# Altium footprint library Kintex_SDR.PcbLib: 72 footprints (part 1 of 5)
Each footprint in its own frame and in the unit in brackets; x right, y up, seen from the top. Pads: shape width x height; smd on the part's side, far side on the other; paste and mask are expansions set on the pad; w line width, h text height; cw(c..) or ccw(c..) is an arc to the next point about the centre after c.
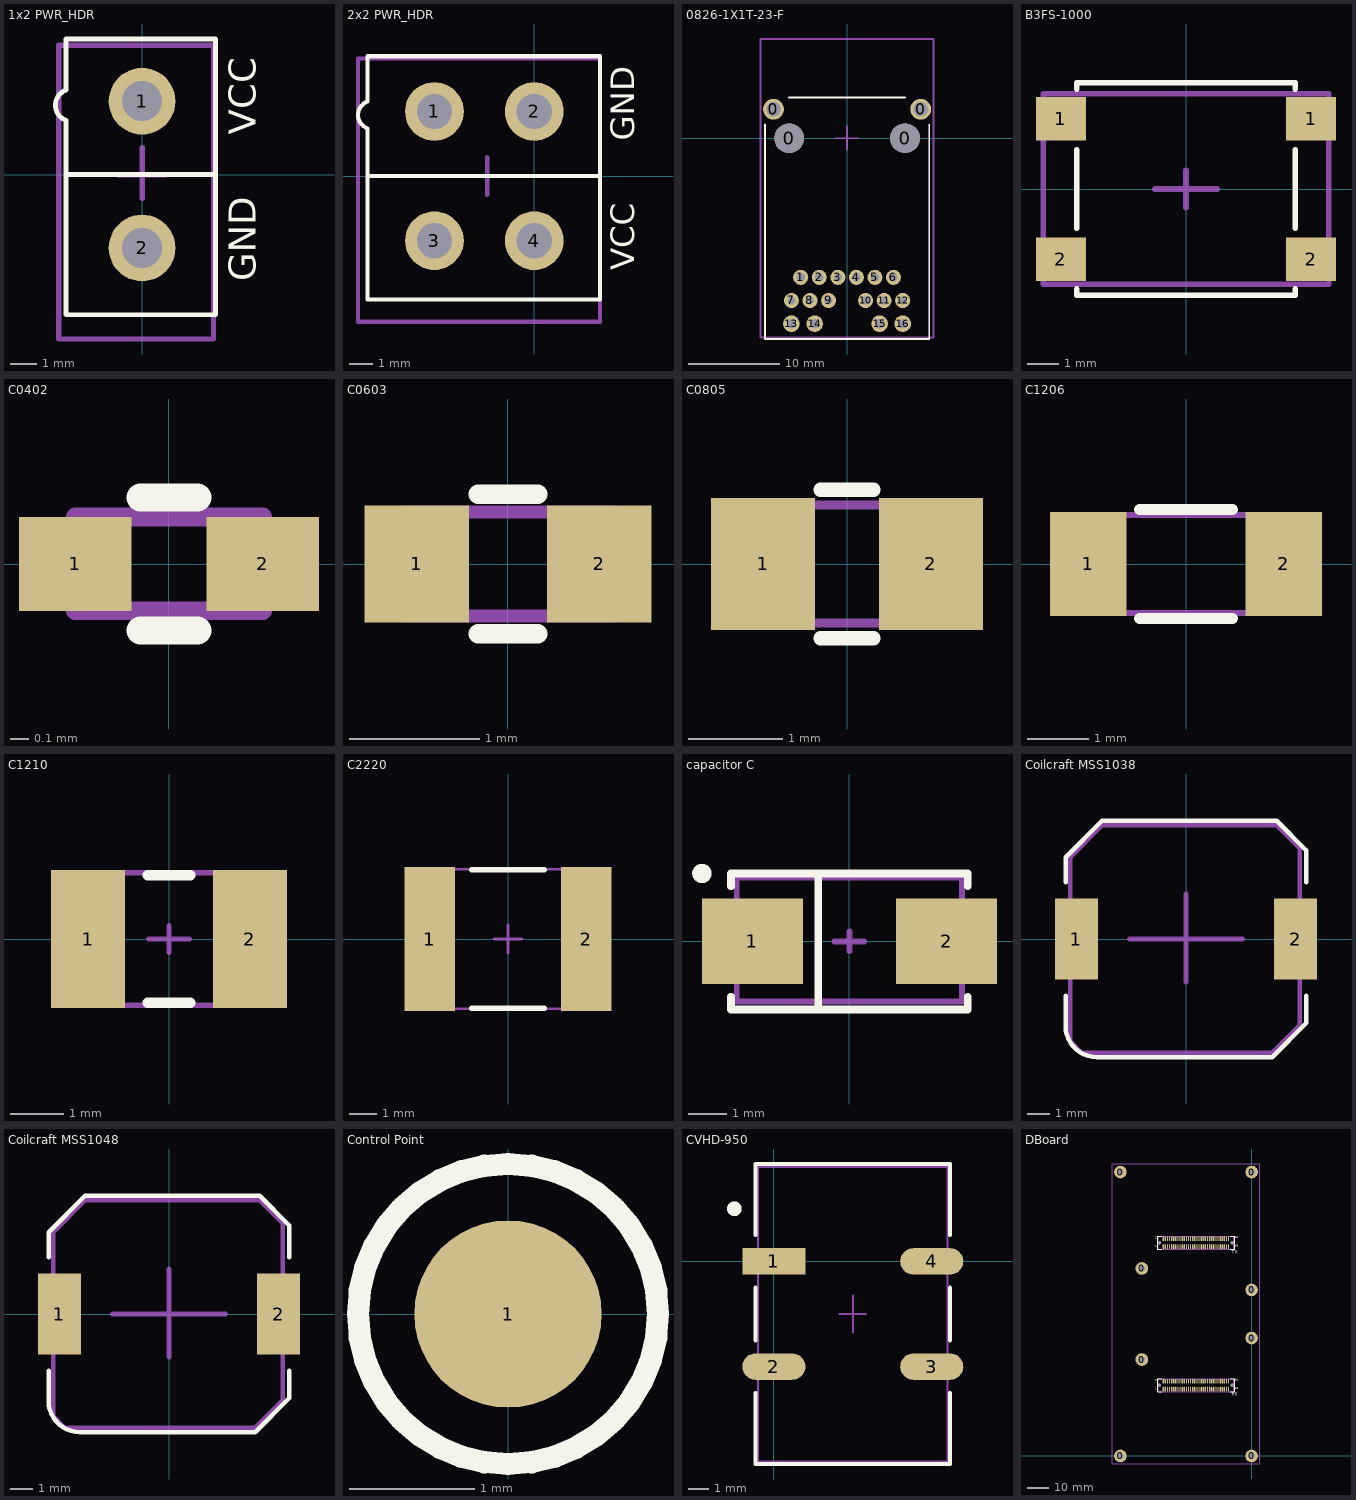
[diagram p0: the footprints below, top view; thin cyan lines are the x and y axes]

## 1x2 PWR_HDR [mm]
height 5
pads (2):
  round 2.5 hole 1.5: 1(0,2.75) 2(0,-2.75)
Top Overlay:
  lines w0.178: -2.85,0 2.75,0 ; -2.85,2 -2.85,-5.25 2.75,-5.25 2.75,5.08 -2.85,5.08 -2.85,3.2 ; -2.84,2.031 cw(c-2.65,2.6) -2.84,3.169
  text "GND" at 4.25,-4 h1.02
  text "VCC" at 4.25,1.5 h1.02
Mechanical 1:
  lines w0.2: -0.889,0 0.889,0 ; 0,-0.889 0,1.016 ; -3.124,-6.16 -3.124,4.84 2.676,4.84 2.676,-6.16 -3.124,-6.16
3D body "User Library-Con_MF-xxMA.step": height 1.5, standoff -14.8, extent -3.124,-6.16 2.676,4.84

## 2x2 PWR_HDR [mm]
height 5
pads (4):
  round 2.5 hole 1.5: 1(-4.25,2.75) 2(0,2.75) 3(-4.25,-2.75) 4(0,-2.75)
Top Overlay:
  lines w0.178: -7.1,2 -7.1,-5.25 2.8,-5.25 2.8,5.1 -7.1,5.1 -7.1,3.2 ; -7.09,2.031 cw(c-6.9,2.6) -7.09,3.169 ; -7,0 2.8,0
  text "VCC" at 4.25,-4 h1.02
  text "GND" at 4.25,1.5 h1.02
Mechanical 1:
  lines w0.178: -2.7,0 -1.3,0 ; -2,-0.8 -2,0.8 ; -7.5,-6.2 2.8,-6.2 2.8,5 -7.5,5 -7.5,-6.2
3D body "User Library-Con_MF-xxMA (2).step": height 12.8, standoff -3.5, extent -7.35,-6.1 2.65,4.9

## 0826-1X1T-23-F [mil] "Gigabit Ethernet Single Port MagJack® with LEDs"
height 536
pads (20):
  round 90 hole 62: 0(-317.5,125) 0(317.5,125)
  round 128 hole 128 unplated: 0(-250,0) 0(250,0)
  round 65 hole 35: 1(-200,-600) 2(-120,-600) 3(-40,-600) 4(40,-600) 5(120,-600) 6(200,-600) 7(-240,-700) 8(-160,-700) 9(-80,-700) 10(80,-700) 11(160,-700) 12(240,-700)
  round 72 hole 40: 13(-240,-800) 14(-140,-800) 15(140,-800) 16(240,-800)
Top Overlay:
  lines w7.87: -354.33,59.06 -354.33,-866.14 354.33,-866.14 354.33,59.06 ; -250,175 250,175
Mechanical 1:
  lines w7.87: -50,0 50,0 ; 0,-50 0,50 ; -373.98,-859.05 373.26,-859.05 373.26,427.95 -373.98,427.95 -373.98,-859.05
3D body "User Library-RJ45-8P_1000-mag.step": height 609.25, standoff -124, extent -373.98,-859.05 373.26,427.95

## B3FS-1000 [mm] "Push Button 6x6 mm"
height 3.1
pads (4):
  rect 1.6x1.4 smd: 1(-4,2.25) 1(4,2.25) 2(-4,-2.25) 2(4,-2.25)
Top Overlay:
  lines w0.178: -3.5,-3.2 -3.5,-3.4 3.5,-3.4 3.5,-3.2 ; -3.5,-1.25 -3.5,1.25 ; -3.5,3.2 -3.5,3.4 3.5,3.4 3.5,3.2 ; 3.5,-1.25 3.5,1.25
Mechanical 1:
  lines w0.178: -1,0 1,0 ; 0,-0.6 0,0.6 ; -4.572,-3.048 4.572,-3.048 4.572,3.048 -4.572,3.048 -4.572,-3.048
3D body "Push_Button.STEP": height 5, standoff 0, extent -4.5,-3 4.5,3

## C0402 [mm] "Chip Capacitor, Body 1.0x0.5mm, IPC High Density"
height 1.3
pads (2):
  rect 0.6x0.5 smd: 1(-0.5,0) 2(0.5,0)
Top Overlay:
  lines w0.15: -0.152,-0.356 0.152,-0.356 ; -0.152,0.356 0.152,0.356
Mechanical 1:
  lines w0.1: -0.5,-0.25 -0.5,0.25 0.5,0.25 0.5,-0.25 -0.5,-0.25
3D body "0402-SMD CAPACITOR.step": height 0.49, standoff -0.01, extent -0.5,-0.25 0.5,0.25

## C0603 [mm] "Chip Capacitor, Body 1.6x0.8mm, IPC High Density"
height 1.3
pads (2):
  rect 0.8x0.9 smd: 1(-0.7,0) 2(0.7,0)
Top Overlay:
  lines w0.15: -0.229,-0.533 0.229,-0.533 ; -0.229,0.533 0.229,0.533
Mechanical 1:
  lines w0.1: -0.8,-0.4 -0.8,0.4 0.8,0.4 0.8,-0.4 -0.8,-0.4
3D body "0603-SMD CAPACITOR.step": height 0.79, standoff -0.01, extent -0.8,-0.4 0.8,0.4

## C0805 [mm] "Chip Capacitor, Body 2.0x1.3mm, IPC High Density"
height 1.4
pads (2):
  rect 1.1x1.4 smd: 1(-0.889,0) 2(0.889,0)
Top Overlay:
  lines w0.15: -0.279,-0.787 0.279,-0.787 ; -0.279,0.787 0.279,0.787
Mechanical 1:
  lines w0.1: -1,-0.625 1,-0.625 1,0.625 -1,0.625 -1,-0.625
3D body "0805-SMD CAPACITOR.step": height 0.59, standoff -0.01, extent -1,-0.625 1,0.625

## C1206 [mm]
height 0.5
pads (2):
  rect 1.25x1.7 smd: 1(-1.6,0) 2(1.6,0)
Top Overlay:
  lines w0.178: -0.762,-0.889 0.762,-0.889 ; -0.762,0.889 0.762,0.889
Mechanical 1:
  lines w0.1: -1.6,-0.8 1.6,-0.8 1.6,0.8 -1.6,0.8 -1.6,-0.8
3D body "1206_SMD CAPACITOR.step": height 0.77, standoff -0.01, extent -1.6,-0.8 1.6,0.8

## C1210 [mm] "Chip Capacitor, Body 3.2x2.5mm, IPC High Density"
height 1.3
pads (2):
  rect 1.4x2.6 smd: 1(-1.524,0) 2(1.524,0)
Top Overlay:
  lines w0.2: -0.4,-1.2 0.4,-1.2 ; -0.4,1.2 0.4,1.2
Mechanical 1:
  lines w0.1: -0.381,0 0.381,0 ; 0,-0.254 0,0.254 ; -1.6,-1.25 -1.6,1.25 1.6,1.25 1.6,-1.25 -1.6,-1.25
3D body "1210-SMD CAPACITOR.step": height 0.77, standoff -0.01, extent -1.6,-1.25 1.6,1.25

## C2220 [mm] "Chip Capacitor"
height 2.5
pads (2):
  rect 1.8x5.15 smd: 1(-2.8,0) 2(2.8,0)
Top Overlay:
  lines w0.2: -1.3,-2.475 1.3,-2.475 ; -1.3,2.475 1.3,2.475
Mechanical 1:
  lines w0.1: -0.5,0 0.5,0 ; 0,-0.5 0,0.5 ; -2.8,-2.5 2.8,-2.5 2.8,2.5 -2.8,2.5 -2.8,-2.5
3D body "User Library-SMD CAPACITOR_2220.step": height 1, standoff 0, extent -2.8,-2.5 2.8,2.5

## capacitor C [mm]
pads (2):
  rect 2.6x2.2 smd: 1(-2.5,0) 2(2.5,0)
Top Overlay:
  circle w0.25: c-3.8,1.75 r0.125
  lines w0.2: -3.048,-1.422 -3.048,-1.75 3.048,-1.75 3.048,-1.422 ; -3.048,1.422 -3.048,1.75 3.048,1.75 3.048,1.422 ; -0.8,-1.75 -0.8,1.75
Mechanical 1:
  lines w0.15: -0.381,0 0.381,0 ; 0,-0.254 0,0.254 ; -2.9,-1.55 2.9,-1.55 2.9,1.65 -2.9,1.65 -2.9,-1.55
3D body "User_Library-Tantalum_Size_C.step": height 2.6, standoff 0, extent -2.9,-1.55 2.9,1.65

## Coilcraft MSS1038 [mm]
height 3.8
pads (2):
  rect 1.905x3.56 smd: 1(-4.826,0) 2(4.826,0)
Top Overlay:
  lines w0.2: -5.3,-2.5 -5.3,-3.837 ccw(c-3.937,-3.837) -3.937,-5.2 3.8,-5.2 5.3,-3.7 5.3,-2.5 ; -5.3,2.5 -5.3,3.6 -3.7,5.2 4,5.2 5.3,3.9 5.3,2.5
Mechanical 1:
  lines w0.2: -2.5,0 2.5,0 ; 0,-1.9 0,2 ; -5.1,-4.5 -5.1,3.6 -3.7,5 4,5 5,4 5,-3.8 3.8,-5 -4.6,-5 -5.1,-4.5
3D body "User Library-MSS1038.step": height 3.8, standoff -0.01, extent -5.105,-5 5.105,5

## Coilcraft MSS1048 [mm]
height 4.8
pads (2):
  rect 1.905x3.56 smd: 1(-4.826,0) 2(4.826,0)
Top Overlay:
  lines w0.2: -5.3,-2.5 -5.3,-3.837 ccw(c-3.937,-3.837) -3.937,-5.2 3.8,-5.2 5.3,-3.7 5.3,-2.5 ; -5.3,2.5 -5.3,3.6 -3.7,5.2 4,5.2 5.3,3.9 5.3,2.5
Mechanical 1:
  lines w0.2: -2.5,0 2.5,0 ; 0,-1.9 0,2 ; -5.1,-4.5 -5.1,3.6 -3.7,5 4,5 5,4 5,-3.8 3.8,-5 -4.6,-5 -5.1,-4.5
3D body "Coilcraft-MSS1048.step": height 5.08, standoff -0.02, extent -5.15,-5.1 5.15,5.1

## Control Point [mm]
pads (1):
  round 1.5 smd: 1(0,0)
Top Overlay:
  circle w0.178: c0,0 r1.2

## CVHD-950 [mil]
height 210
pads (4):
  rect 120x50 smd: 1(0,0)
  oval 120x50 smd: 2(0,-200) 3(300,-200) 4(300,0)
Top Overlay:
  circle w13.78: c-75,100 r7.07
  lines w7.87: -35,-250 -35,-385 335,-385 335,-250 ; -35,-150 -35,-50 ; -35,50 -35,185 335,185 335,50 ; 335,-150 335,-50
Mechanical 1:
  lines w3.94: 125,-100 175,-100 ; 150,-135 150,-65 ; -30.31,-380 -30.31,179.05 330.31,179.05 330.31,-380 -30.31,-380
3D body "User Library-CVHD-950.step": height 208.66, standoff 0, extent -30.31,-380 330.31,179.05

## DBoard [mil] "USRP DBoard"
height 393.7
pads (140):
  round 236.22 hole 118.11: 0(-2450,0) 0(-2450,5300) 0(-2050,1800) 0(-2050,3500) 0(0,0) 0(0,2200) 0(0,3100) 0(1,5299)
  round 59.06 hole 59.06 unplated: 0(-1717,1320) 0(-1717,3980) 0(-363,1320) 0(-363,3980)
  oval 24x92 smd: 1(-1650,3906) 2(-1650,4054) 3(-1611,3906) 4(-1611,4054) 5(-1572,3906) 6(-1572,4054) 7(-1532,3906) 8(-1532,4054) 9(-1493,3906) 10(-1493,4054) 11(-1454,3906) 12(-1454,4054) 13(-1414,3906) 14(-1414,4054) 15(-1375,3906) 16(-1375,4054) 17(-1336,3906) 18(-1336,4054) 19(-1296,3906) 20(-1296,4054) 21(-1257,3906) 22(-1257,4054) 23(-1217,3906) 24(-1217,4054) 25(-1178,3906) 26(-1178,4054) 27(-1139,3906) 28(-1139,4054) 29(-1099,3906) 30(-1099,4054) 31(-1060,3906) 32(-1060,4054) 33(-1021,3906) 34(-1021,4054) 35(-981,3906) 36(-981,4054) 37(-942,3906) 38(-942,4054) 39(-902,3906) 40(-902,4054) 41(-863,3906) 42(-863,4054) 43(-824,3906) 44(-824,4054) 45(-784,3906) 46(-784,4054) 47(-745,3906) 48(-745,4054) 49(-706,3906) 50(-706,4054) 51(-666,3906) 52(-666,4054) 53(-627,3906) 54(-627,4054) 55(-588,3906) 56(-588,4054) 57(-548,3906) 58(-548,4054) 59(-509,3906) 60(-509,4054) 61(-469,3906) 62(-469,4054) 63(-430,3906) 64(-430,4054) 65(-1650,1246) 66(-1650,1394) 67(-1611,1246) 68(-1611,1394) 69(-1572,1246) 70(-1572,1394) 71(-1532,1246) 72(-1532,1394) 73(-1493,1246) 74(-1493,1394) 75(-1454,1246) 76(-1454,1394) 77(-1414,1246) 78(-1414,1394) 79(-1375,1246) 80(-1375,1394) 81(-1336,1246) 82(-1336,1394) 83(-1296,1246) 84(-1296,1394) 85(-1257,1246) 86(-1257,1394) 87(-1217,1246) 88(-1217,1394) 89(-1178,1246) 90(-1178,1394) 91(-1139,1246) 92(-1139,1394) 93(-1099,1246) 94(-1099,1394) 95(-1060,1246) 96(-1060,1394) 97(-1021,1246) 98(-1021,1394) 99(-981,1246) 100(-981,1394) 101(-942,1246) 102(-942,1394) 103(-902,1246) 104(-902,1394) 105(-863,1246) 106(-863,1394) 107(-824,1246) 108(-824,1394) 109(-784,1246) 110(-784,1394) 111(-745,1246) 112(-745,1394) 113(-706,1246) 114(-706,1394) 115(-666,1246) 116(-666,1394) 117(-627,1246) 118(-627,1394) 119(-588,1246) 120(-588,1394) 121(-548,1246) 122(-548,1394) 123(-509,1246) 124(-509,1394) 125(-469,1246) 126(-469,1394) 127(-430,1246) 128(-430,1394)
Top Overlay:
  lines w7: -1677.63,1195 -1756.37,1195 -1756.37,1445 -1677.63,1445 ; -1677.63,3855 -1756.37,3855 -1756.37,4105 -1677.63,4105 ; -398.1,1195 -319.36,1195 -319.36,1445 -398.1,1445 ; -398.1,3855 -319.36,3855 -319.36,4105 -398.1,4105
  text "64" at -301.96,4045.94 h50
  text "63" at -301.96,3888.46 h50
  text "2" at -1800,4038.48 h50
  text "1" at -1800,3881 h50
  text "64" at -301.96,1385.94 h50
  text "63" at -301.96,1228.46 h50
  text "2" at -1799.36,1377.09 h50
  text "1" at -1799.36,1219.61 h50
  text "TX" at -375,3750 h100
  text "RX" at -375,1100 h100
Mechanical 1:
  lines w3.94: -1746.53,1199.92 -1746.53,1440.08 -333.14,1440.08 -333.14,1199.92 -1746.53,1199.92 ; -1746.53,3859.92 -1746.53,4100.08 -333.14,4100.08 -333.14,3859.92 -1746.53,3859.92
  lines w10: -2600,-150 -2600,5450 150,5450 150,-150 -2600,-150
3D body "714362164.stp": height 328.74, standoff -29.53, extent -1746.53,3859.92 -333.14,4100.08
3D body "714362164.stp": height 328.74, standoff -29.53, extent -1746.53,1199.92 -333.14,1440.08